# Altium footprint library Connectors.PcbLib: 92 footprints (part 4 of 6)
Each footprint in its own frame and in the unit in brackets; x right, y up, seen from the top. Pads: shape width x height; smd on the part's side, far side on the other; paste and mask are expansions set on the pad; w line width, h text height; cw(c..) or ccw(c..) is an arc to the next point about the centre after c.
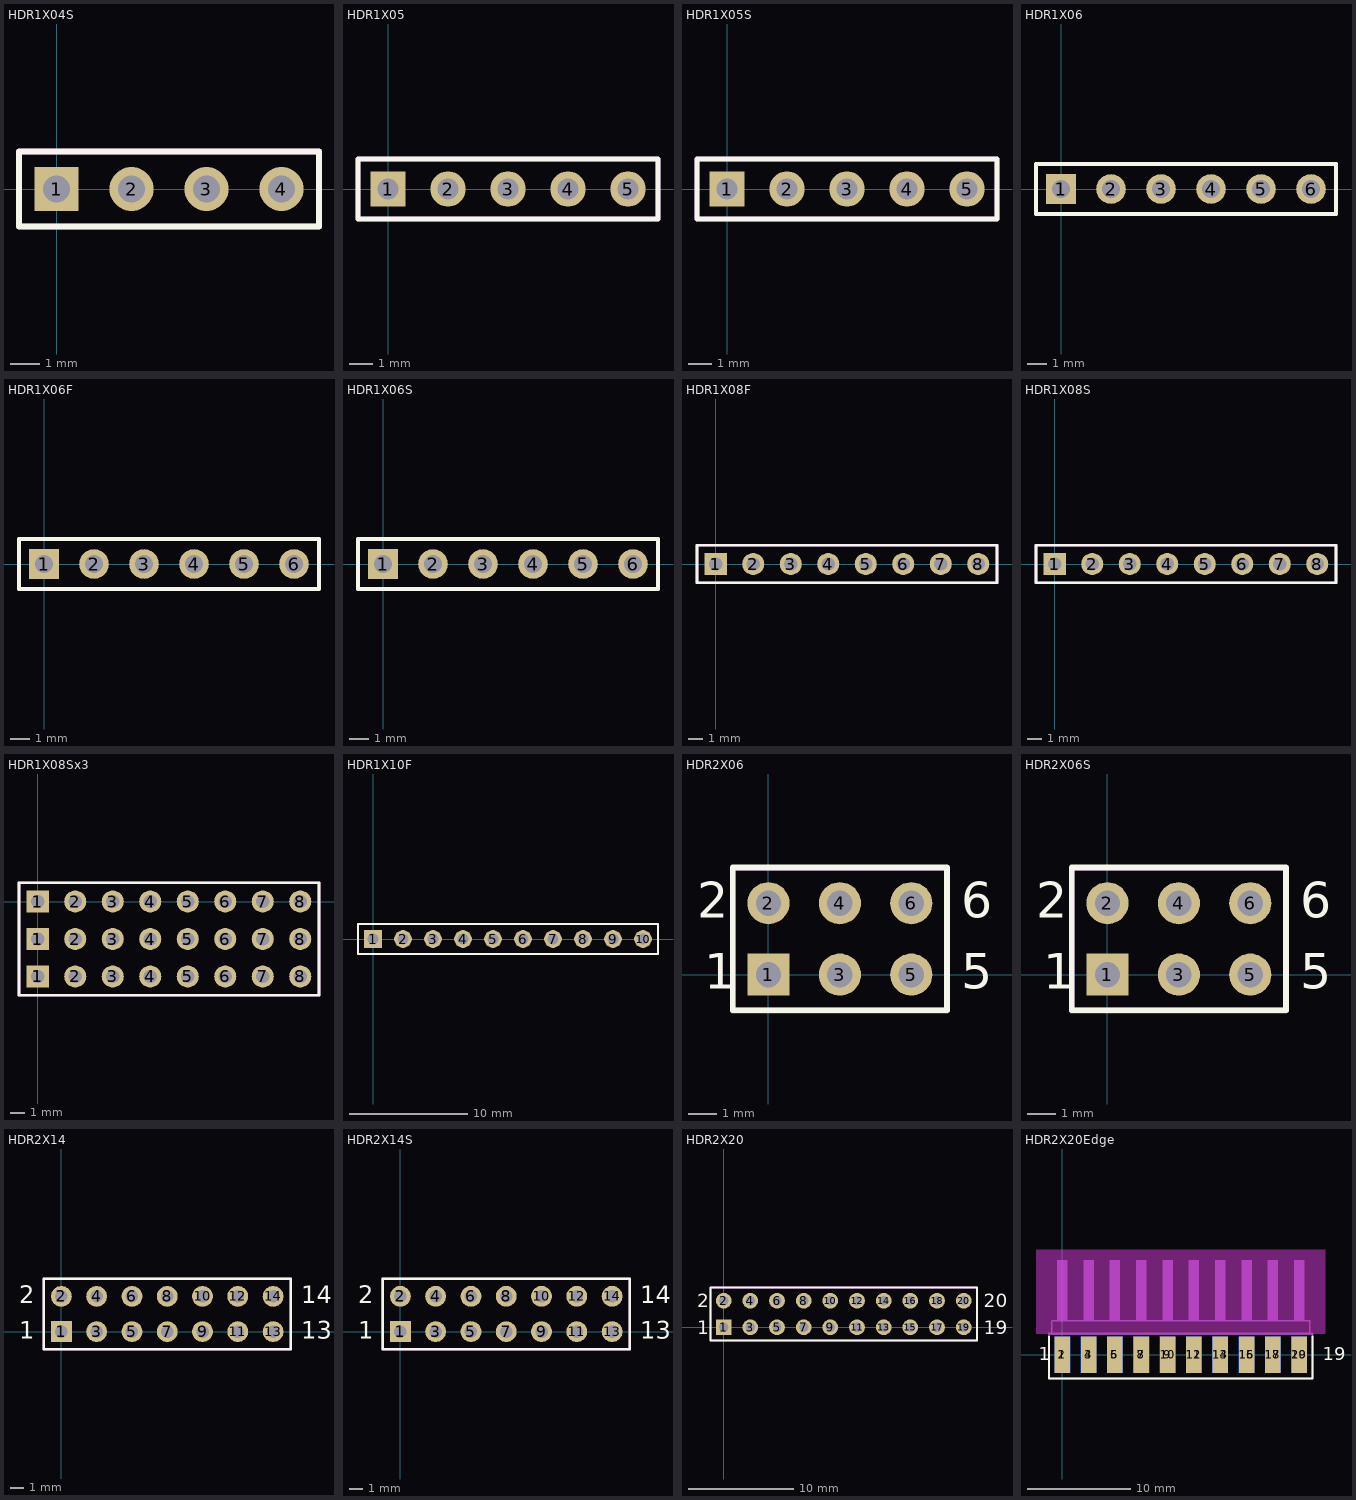
[diagram p3: the footprints below, top view; thin cyan lines are the x and y axes]

## HDR1X04S [mm] "Connector; Header; 4 Position"
pads (4):
  rect 1.5x1.5 hole 0.9: 1(0,0)
  round 1.5 hole 0.9: 2(2.54,0) 3(5.08,0) 4(7.62,0)
Top Overlay:
  lines w0.2: -1.27,-1.27 8.89,-1.27 8.89,1.27 -1.27,1.27 -1.27,-1.27
Mechanical 13:
  lines w0.2: -1.27,-1.27 -1.27,1.27 8.89,1.27 8.89,-1.27 -1.27,-1.27
  text ".Comment" at -0.675,-1.925 h0.51
  text ".Designator" at -1.125,1.625 h0.51

## HDR1X05 [mm] "Connector; Header; 5 Position"
pads (5):
  rect 1.5x1.5 hole 0.9: 1(0,0)
  round 1.5 hole 0.9: 2(2.54,0) 3(5.08,0) 4(7.62,0) 5(10.16,0)
Top Overlay:
  lines w0.2: -1.27,-1.27 11.43,-1.27 11.43,1.27 -1.27,1.27 -1.27,-1.27
Mechanical 13:
  lines w0.2: -1.27,-1.27 11.43,-1.27 11.43,1.27 -1.27,1.27 -1.27,-1.27
  text ".Comment" at -0.675,-1.925 h0.51
  text ".Designator" at -1.125,1.625 h0.51
3D body "pin_header_aw_109_05-t.stp": height 8.2, standoff -3, extent -1.17,-1.251 11.53,1.245

## HDR1X05S [mm] "Connector; Header; 5 Position"
pads (5):
  rect 1.5x1.5 hole 0.9: 1(0,0)
  round 1.5 hole 0.9: 2(2.54,0) 3(5.08,0) 4(7.62,0) 5(10.16,0)
Top Overlay:
  lines w0.2: -1.27,-1.27 -1.27,1.27 11.43,1.27 11.43,-1.27 -1.27,-1.27
Mechanical 13:
  lines w0.2: -1.27,-1.27 11.43,-1.27 11.43,1.27 -1.27,1.27 -1.27,-1.27
  text ".Designator" at -1.125,1.625 h0.51
  text ".Comment" at -0.675,-1.925 h0.51

## HDR1X06 [mm] "Connector; Header; 6 Position"
pads (6):
  rect 1.5x1.5 hole 0.9: 1(0,0)
  round 1.5 hole 0.9: 2(2.54,0) 3(5.08,0) 4(7.62,0) 5(10.16,0) 6(12.7,0)
Top Overlay:
  lines w0.2: -1.27,-1.27 -1.27,1.27 13.97,1.27 13.97,-1.27 -1.27,-1.27
Mechanical 13:
  lines w0.2: -1.27,-1.27 -1.27,1.27 13.97,1.27 13.97,-1.27 -1.27,-1.27
  text ".Designator" at -1.125,1.625 h0.51
  text ".Comment" at -0.675,-1.925 h0.51
3D body "pin_header_aw_109_06-t.stp": height 8.2, standoff -3, extent -1.37,-1.245 13.87,1.251

## HDR1X06F [mm] "Connector; Female Header; 6 Position"
height 8.51
pads (6):
  rect 1.5x1.5 hole 0.9: 1(0,0)
  round 1.5 hole 0.9: 2(2.54,0) 3(5.08,0) 4(7.62,0) 5(10.16,0) 6(12.7,0)
Top Overlay:
  lines w0.2: -1.27,-1.27 -1.27,1.27 13.97,1.27 13.97,-1.27 -1.27,-1.27
Mechanical 13:
  lines w0.2: -1.27,-1.27 -1.27,1.27 13.97,1.27 13.97,-1.27 -1.27,-1.27
  text ".Designator" at -1.125,1.625 h0.51
  text ".Comment" at -0.675,-1.925 h0.51
3D body "SSQ-106-01-G-S.stp": height 8.51, standoff -2.64, extent -1.524,-1.206 14.224,1.207

## HDR1X06S [mm] "Connector; Header; 6 Position"
pads (6):
  rect 1.5x1.5 hole 0.9: 1(0,0)
  round 1.5 hole 0.9: 2(2.54,0) 3(5.08,0) 4(7.62,0) 5(10.16,0) 6(12.7,0)
Top Overlay:
  lines w0.2: -1.27,-1.27 -1.27,1.27 13.97,1.27 13.97,-1.27 -1.27,-1.27
Mechanical 13:
  lines w0.2: -1.27,-1.27 -1.27,1.27 13.97,1.27 13.97,-1.27 -1.27,-1.27
  text ".Designator" at -1.125,1.625 h0.51
  text ".Comment" at -0.675,-1.925 h0.51

## HDR1X08F [mm] "Connector; Female Header; 8 Position"
height 8.51
pads (8):
  rect 1.5x1.5 hole 0.9: 1(0,0)
  round 1.5 hole 0.9: 2(2.54,0) 3(5.08,0) 4(7.62,0) 5(10.16,0) 6(12.7,0) 7(15.24,0) 8(17.78,0)
Top Overlay:
  lines w0.2: -1.27,-1.27 19.05,-1.27 19.05,1.27 -1.27,1.27 -1.27,-1.27
Mechanical 13:
  lines w0.2: -1.27,-1.27 19.05,-1.27 19.05,1.27 -1.27,1.27 -1.27,-1.27
  text ".Comment" at -0.675,-1.925 h0.51
  text ".Designator" at -1.125,1.625 h0.51
3D body "SSQ-108-01-G-S.stp": height 8.51, standoff -2.64, extent -1.524,-1.206 19.304,1.207

## HDR1X08S [mm] "Connector; Header; 8 Position"
pads (8):
  rect 1.5x1.5 hole 0.9: 1(0,0)
  round 1.5 hole 0.9: 2(2.54,0) 3(5.08,0) 4(7.62,0) 5(10.16,0) 6(12.7,0) 7(15.24,0) 8(17.78,0)
Top Overlay:
  lines w0.2: -1.27,-1.27 19.05,-1.27 19.05,1.27 -1.27,1.27 -1.27,-1.27
Mechanical 13:
  lines w0.2: -1.27,-1.27 19.05,-1.27 19.05,1.27 -1.27,1.27 -1.27,-1.27
  text ".Comment" at -0.675,-1.925 h0.51
  text ".Designator" at -1.125,1.625 h0.51

## HDR1X08Sx3 [mm] "Connector; Header; 8 Position, 3 rows"
pads (24):
  rect 1.5x1.5 hole 0.9: 1(0,-5.08) 1(0,-2.54) 1(0,0)
  round 1.5 hole 0.9: 2(2.54,-5.08) 2(2.54,-2.54) 2(2.54,0) 3(5.08,-5.08) 3(5.08,-2.54) 3(5.08,0) 4(7.62,-5.08) 4(7.62,-2.54) 4(7.62,0) 5(10.16,-5.08) 5(10.16,-2.54) 5(10.16,0) 6(12.7,-5.08) 6(12.7,-2.54) 6(12.7,0) 7(15.24,-5.08) 7(15.24,-2.54) 7(15.24,0) 8(17.78,-5.08) 8(17.78,-2.54) 8(17.78,0)
Top Overlay:
  lines w0.2: -1.27,-6.35 -1.27,1.27 19.05,1.27 19.05,-6.35 -1.27,-6.35
Mechanical 13:
  lines w0.2: -1.27,-6.35 -1.27,1.27 19.05,1.27 19.05,-6.35 -1.27,-6.35
  text ".Designator" at -1.125,1.625 h0.51
  text ".Comment" at 5.334,1.524 h0.51

## HDR1X10F [mm] "Connector; Female Header; 10 Position"
height 8.51
pads (10):
  rect 1.5x1.5 hole 0.9: 1(0,0)
  round 1.5 hole 0.9: 2(2.54,0) 3(5.08,0) 4(7.62,0) 5(10.16,0) 6(12.7,0) 7(15.24,0) 8(17.78,0) 9(20.32,0) 10(22.86,0)
Top Overlay:
  lines w0.2: -1.27,-1.27 -1.27,1.27 24.13,1.27 24.13,-1.27 -1.27,-1.27
Mechanical 13:
  lines w0.2: -1.27,-1.27 -1.27,1.27 24.13,1.27 24.13,-1.27 -1.27,-1.27
  text ".Designator" at -1.125,1.625 h0.51
  text ".Comment" at -0.675,-1.925 h0.51
3D body "SSQ-110-01-G-S.stp": height 8.51, standoff -2.64, extent -1.524,-1.206 24.384,1.207

## HDR2X06 [mm] "Connector; Header; 3x2 Position"
pads (6):
  rect 1.5x1.5 hole 0.9: 1(0,0)
  round 1.5 hole 0.9: 2(0,2.54) 3(2.54,0) 4(2.54,2.54) 5(5.08,0) 6(5.08,2.54)
Top Overlay:
  lines w0.2: -1.27,-1.27 6.35,-1.27 6.35,3.81 -1.27,3.81 -1.27,-1.27
  text "5" at 6.858,-0.508 h1.27
  text "6" at 6.858,2.032 h1.27
  text "1" at -2.286,-0.508 h1.27
  text "2" at -2.54,2.032 h1.27
Mechanical 13:
  lines w0.2: -1.275,-1.275 -1.275,3.805 6.35,3.805 6.35,-1.275 -1.275,-1.275
  text ".Designator" at -1.125,4.165 h0.51
  text ".Comment" at -0.975,-2.05 h0.51
3D body "pin_header_awl254-dg-g06d.stp": height 8.5, standoff -3, extent -1.27,-1.27 6.35,3.81

## HDR2X06S [mm] "Connector; Header; 3x2 Position"
pads (6):
  rect 1.5x1.5 hole 0.9: 1(0,0)
  round 1.5 hole 0.9: 2(0,2.54) 3(2.54,0) 4(2.54,2.54) 5(5.08,0) 6(5.08,2.54)
Top Overlay:
  lines w0.2: -1.27,-1.27 6.35,-1.27 6.35,3.81 -1.27,3.81 -1.27,-1.27
  text "5" at 6.858,-0.508 h1.27
  text "6" at 6.858,2.032 h1.27
  text "1" at -2.286,-0.508 h1.27
  text "2" at -2.54,2.032 h1.27
Mechanical 13:
  lines w0.2: -1.275,-1.275 -1.275,3.805 6.35,3.805 6.35,-1.275 -1.275,-1.275
  text ".Designator" at -1.125,4.165 h0.51
  text ".Comment" at -0.975,-2.05 h0.51

## HDR2X14 [mm] "Connector; Header; 7x2 Position"
pads (14):
  rect 1.5x1.5 hole 0.9: 1(0,0)
  round 1.5 hole 0.9: 2(0,2.54) 3(2.54,0) 4(2.54,2.54) 5(5.08,0) 6(5.08,2.54) 7(7.62,0) 8(7.62,2.54) 9(10.16,0) 10(10.16,2.54) 11(12.7,0) 12(12.7,2.54) 13(15.24,0) 14(15.24,2.54)
Top Overlay:
  lines w0.2: -1.27,-1.27 16.51,-1.27 16.51,3.81 -1.27,3.81 -1.27,-1.27
  text "1" at -3.048,-0.508 h1.27
  text "2" at -3.048,2.032 h1.27
  text "13" at 17.272,-0.508 h1.27
  text "14" at 17.272,2.032 h1.27
Mechanical 13:
  lines w0.2: -1.27,-1.27 -1.27,3.81 16.51,3.81 16.51,-1.27 -1.27,-1.27
  text ".Designator" at -1.125,4.165 h0.51
  text ".Comment" at -0.975,-2.05 h0.51
3D body "pin_header_awl254-dg-g14d.stp": height 8.5, standoff -3, extent -1.27,-1.27 16.51,3.81

## HDR2X14S [mm] "Connector; Header; 7x2 Position"
pads (14):
  rect 1.5x1.5 hole 0.9: 1(0,0)
  round 1.5 hole 0.9: 2(0,2.54) 3(2.54,0) 4(2.54,2.54) 5(5.08,0) 6(5.08,2.54) 7(7.62,0) 8(7.62,2.54) 9(10.16,0) 10(10.16,2.54) 11(12.7,0) 12(12.7,2.54) 13(15.24,0) 14(15.24,2.54)
Top Overlay:
  lines w0.2: -1.27,-1.27 16.51,-1.27 16.51,3.81 -1.27,3.81 -1.27,-1.27
  text "13" at 17.272,-0.508 h1.27
  text "14" at 17.272,2.032 h1.27
  text "1" at -3.048,-0.508 h1.27
  text "2" at -3.048,2.032 h1.27
Mechanical 13:
  lines w0.2: -1.275,-1.275 -1.275,3.805 16.505,3.805 16.505,-1.275 -1.275,-1.275
  text ".Designator" at -1.125,4.165 h0.51
  text ".Comment" at -0.975,-2.05 h0.51

## HDR2X20 [mm] "Connector; Header; 10x2 Position"
pads (20):
  rect 1.5x1.5 hole 0.9: 1(0,0)
  round 1.5 hole 0.9: 2(0,2.54) 3(2.54,0) 4(2.54,2.54) 5(5.08,0) 6(5.08,2.54) 7(7.62,0) 8(7.62,2.54) 9(10.16,0) 10(10.16,2.54) 11(12.7,0) 12(12.7,2.54) 13(15.24,0) 14(15.24,2.54) 15(17.78,0) 16(17.78,2.54) 17(20.32,0) 18(20.32,2.54) 19(22.86,0) 20(22.86,2.54)
Top Overlay:
  lines w0.2: -1.27,-1.27 24.13,-1.27 24.13,3.81 -1.27,3.81 -1.27,-1.27
  text "19" at 24.765,-0.635 h1.27
  text "20" at 24.765,1.905 h1.27
  text "1" at -2.54,-0.635 h1.27
  text "2" at -2.54,1.905 h1.27
Mechanical 13:
  lines w0.2: -1.27,-1.27 -1.27,3.81 24.13,3.81 24.13,-1.27 -1.27,-1.27
  text ".Designator" at -1.125,4.19 h0.51
  text ".Comment" at -0.975,-2.025 h0.51
3D body "pin_header_awl254-dg-g20d.stp": height 8.5, standoff -3, extent -1.27,-1.27 24.13,3.81

## HDR2X20Edge [mm] "Connector; Header; 10x2 Position, edge"
pads (20):
  rect 1.5x3.5 smd paste-5: 1(0,0) 3(2.54,0) 5(5.08,0) 7(7.62,0) 9(10.16,0) 11(12.7,0) 13(15.24,0) 15(17.78,0) 17(20.32,0) 19(22.86,0)
  rect 1.5x3.5 smd far side paste-5: 2(0,0) 4(2.54,0) 6(5.08,0) 8(7.62,0) 10(10.16,0) 12(12.7,0) 14(15.24,0) 16(17.78,0) 18(20.32,0) 20(22.86,0)
Top Overlay:
  lines w0.2: -1.27,1.778 -1.27,-2.286 24.13,-2.286 24.13,1.778
  text "19" at 25.146,-0.508 h1.27
  text "1" at -2.286,-0.508 h1.27
Bottom Overlay:
  lines w0.2: -1.27,1.778 -1.27,-2.286 24.13,-2.286 24.13,1.778
  text "20" at 26.924,-0.508 h1.27
  text "2" at -1.778,-0.508 h1.27
Keep-Out Layer:
  board cut-out: 25.4,2.032 25.4,10.16 -2.54,10.16 -2.54,2.032
Mechanical 13:
  rectangle: 22.352,3.302 23.368,9.144
  rectangle: 19.812,3.302 20.828,9.144
  rectangle: 17.272,3.302 18.288,9.144
  rectangle: 14.732,3.302 15.748,9.144
  rectangle: 12.192,3.302 13.208,9.144
  rectangle: 9.652,3.302 10.668,9.144
  rectangle: 7.112,3.302 8.128,9.144
  rectangle: 4.572,3.302 5.588,9.144
  rectangle: 2.032,3.302 3.048,9.144
  rectangle: -0.508,3.302 0.508,9.144
  lines w0.152: -1.016,2.032 -1.016,3.302 23.876,3.302 23.876,2.032
  lines w0.2: -1.27,-2.286 -1.27,2.032 24.13,2.032 24.13,-2.286 -1.27,-2.286
  text ".Designator" at -1.27,-3.81 h0.51
  text ".Comment" at -1.27,-3.048 h0.51
Mechanical 14:
  rectangle: -0.508,3.302 0.508,9.144
  rectangle: 2.032,3.302 3.048,9.144
  rectangle: 4.572,3.302 5.588,9.144
  rectangle: 7.112,3.302 8.128,9.144
  rectangle: 9.652,3.302 10.668,9.144
  rectangle: 12.192,3.302 13.208,9.144
  rectangle: 14.732,3.302 15.748,9.144
  rectangle: 17.272,3.302 18.288,9.144
  rectangle: 19.812,3.302 20.828,9.144
  rectangle: 22.352,3.302 23.368,9.144
  lines w0.152: -1.016,2.032 -1.016,3.302 23.876,3.302 23.876,2.032
  lines w0.2: -1.27,-2.286 24.13,-2.286 24.13,2.032 -1.27,2.032 -1.27,-2.286
  text ".Comment" at -1.27,-3.048 h0.51
  text ".Designator" at -1.27,-3.81 h0.51
3D body "pin_header_awl254-dg-g20d.stp": height 1.59, standoff -3.49, extent -1.27,-1.73 24.13,9.77